# Altium footprint library custom.PcbLib: 317 footprints (part 12 of 20)
Each footprint in its own frame and in the unit in brackets; x right, y up, seen from the top. Pads: shape width x height; smd on the part's side, far side on the other; paste and mask are expansions set on the pad; w line width, h text height; cw(c..) or ccw(c..) is an arc to the next point about the centre after c.
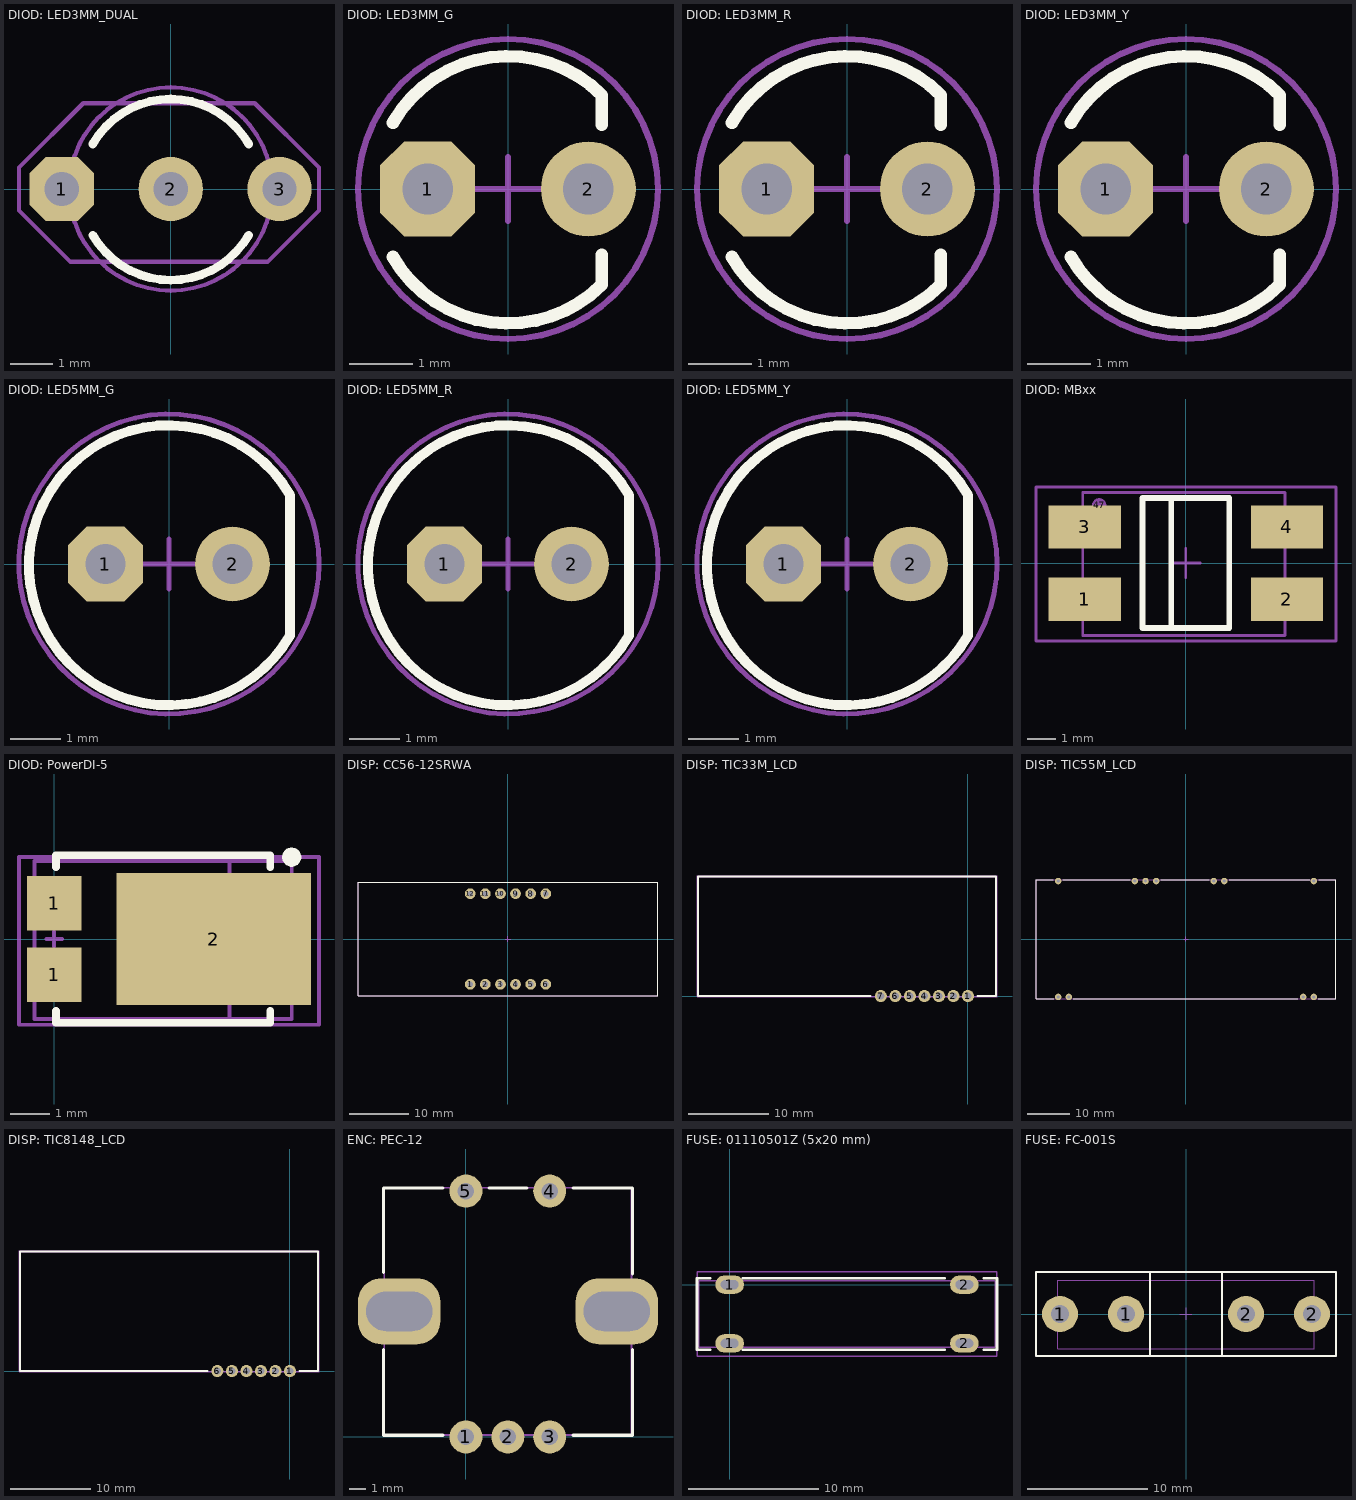
[diagram p11: the footprints below, top view; thin cyan lines are the x and y axes]

## DIOD: LED3MM_DUAL [mm] "Leaded Dual Color 3mm Led"
height 10
pads (3):
  oct 1.5x1.5 hole 0.8: 1(-2.54,0)
  round 1.5 hole 0.8: 2(0,0) 3(2.54,0)
Top Overlay:
  lines w0.2: -1.819,-1.075 ccw(c0,-0.025) 1.819,-1.075 ; -1.819,1.05 cw(c0,0) 1.819,1.05
Top Assy:
  circle w0.1: c0,0 r2.372
Size Area:
  lines w0.1: -3.54,-0.5 -2.34,-1.7 2.26,-1.7 3.46,-0.5 3.46,0.5 1.96,2 -2.04,2 -3.54,0.5 -3.54,-0.5 ; -0.5,0 0.5,0 -0.5,0 ; 0,-0.5 0,0.5 0,-0.5
3D body "3mm_led_dual.STEP": height 11.5, standoff -1, extent -2.846,-1.585 2.838,1.915

## DIOD: LED3MM_G [mm] "Green Leaded Led, 3 mm"
height 12
pads (2):
  oct 1.5x1.5 hole 0.8: 1(-1.27,0)
  round 1.5 hole 0.8: 2(1.27,0)
Top Overlay:
  lines w0.2: -1.819,-1.075 ccw(c0,-0.025) 1.485,-1.51 1.485,-1.04 ; -1.819,1.05 cw(c0,0) 1.485,1.485 1.485,1.015
Top Assy:
  circle w0.1: c0,0 r2.372
Size Area:
  circle w0.1: c0,0 r2.372
  lines w0.1: -0.5,0 0.5,0 ; 0,-0.5 0,0.5
3D body "3mm_led_grn.STEP": height 12, standoff -1, extent -2,-2 2,2

## DIOD: LED3MM_R [mm] "Red Leaded Led, 3 mm"
height 12
pads (2):
  oct 1.5x1.5 hole 0.8: 1(-1.27,0)
  round 1.5 hole 0.8: 2(1.27,0)
Top Overlay:
  lines w0.2: -1.819,-1.075 ccw(c0,-0.025) 1.485,-1.51 1.485,-1.04 ; -1.819,1.05 cw(c0,0) 1.485,1.485 1.485,1.015
Top Assy:
  circle w0.1: c0,0 r2.372
Size Area:
  circle w0.1: c0,0 r2.372
  lines w0.1: -0.5,0 0.5,0 ; 0,-0.5 0,0.5
3D body "3mm_led_red.STEP": height 12, standoff -1, extent -2,-2 2,2

## DIOD: LED3MM_Y [mm] "Yellow Leaded Led, 3 mm"
height 12
pads (2):
  oct 1.5x1.5 hole 0.8: 1(-1.27,0)
  round 1.5 hole 0.8: 2(1.27,0)
Top Overlay:
  lines w0.2: 1.485,-1.51 cw(c0,-0.025) -1.819,-1.075 ccw(c0,-0.025) 1.485,-1.51 ; 1.485,-1.51 1.485,-1.04 1.485,-1.51 ; 1.485,1.485 ccw(c0,0) -1.819,1.05 cw(c0,0) 1.485,1.485 ; 1.485,1.485 1.485,1.015 1.485,1.485
Top Assy:
  circle w0.1: c0,0 r2.372
Size Area:
  circle w0.1: c0,0 r2.372
  lines w0.1: -0.5,0 0.5,0 ; 0,-0.5 0,0.5
3D body "3mm_led_yell.STEP": height 12, standoff -1, extent -2,-2 2,2

## DIOD: LED5MM_G [mm] "Green Leaded Led, 5 mm"
height 12
pads (2):
  oct 1.5x1.5 hole 0.8: 1(-1.27,0)
  round 1.5 hole 0.8: 2(1.27,0)
Top Overlay:
  lines w0.2: 2.425,-1.425 cw(c0,-0.025) 2.425,1.375 2.425,-1.425
Top Assy:
  circle w0.1: c0,0 r3
Size Area:
  circle w0.1: c0,0 r3
  lines w0.1: -0.5,0 0.5,0 ; 0,-0.5 0,0.5
3D body "5mm_led_grn.STEP": height 14.5, standoff -1, extent -3,-3 3,3

## DIOD: LED5MM_R [mm] "Red Leaded Led, 5 mm"
height 12
pads (2):
  oct 1.5x1.5 hole 0.8: 1(-1.27,0)
  round 1.5 hole 0.8: 2(1.27,0)
Top Overlay:
  lines w0.2: 2.425,-1.425 cw(c0,-0.025) 2.425,1.375 2.425,-1.425
Top Assy:
  circle w0.1: c0,0 r3
Size Area:
  circle w0.1: c0,0 r3
  lines w0.1: -0.5,0 0.5,0 ; 0,-0.5 0,0.5
3D body "5mm_led_red.STEP": height 14.5, standoff -1, extent -3,-3 3,3

## DIOD: LED5MM_Y [mm] "Yellow Leaded Led, 5 mm"
height 12
pads (2):
  oct 1.5x1.5 hole 0.8: 1(-1.27,0)
  round 1.5 hole 0.8: 2(1.27,0)
Top Overlay:
  lines w0.2: 2.425,-1.425 cw(c0,-0.025) 2.425,1.375 2.425,-1.425
Top Assy:
  circle w0.1: c0,0 r3
Size Area:
  circle w0.1: c0,0 r3
  lines w0.1: -0.5,0 0.5,0 ; 0,-0.5 0,0.5
3D body "5mm_led_yell.STEP": height 14.5, standoff -1, extent -3,-3 3,3

## DIOD: MBxx [mm] "SMD Diode Bridge"
height 2
pads (5):
  rect 2.5x1.5 smd: 1(-3.5,-1.25) 2(3.5,-1.25) 3(-3.5,1.25) 4(3.5,1.25)
  round 0.5 on Mech1: 47(-3,2)
Top Overlay:
  lines w0.2: -0.5,-2.25 -0.5,2.25 ; -1.5,-2.25 1.5,-2.25 1.5,2.25 -1.5,2.25 -1.5,-2.25
Top Assy:
  lines w0.1: -3.566,-2.502 3.434,-2.502 3.434,2.448 -3.566,2.448 -3.566,-2.502
Size Area:
  lines w0.1: -0.5,0 0.5,0 ; 0,-0.5 0,0.5 ; -5.183,-2.694 5.197,-2.694 5.197,2.631 -5.183,2.631 -5.183,-2.694
3D body "MBxx.STEP": height 3.5, standoff -0.02, extent -3.566,-2.502 3.434,2.448

## DIOD: PowerDI-5 [mm]
pads (4):
  rect 1.4x1.4 smd: 1(0,-0.92) 1(0,0.92)
  rect 5x3.4 smd: 2(4.1,0)
  round 0.5 on Top Overlay: ""(6.1,2.1)
Top Overlay:
  lines w0.2: 0.05,-1.85 0.05,-2.15 5.55,-2.15 5.55,-1.85 ; 0.05,1.85 0.05,2.15 5.55,2.15 5.55,1.85
Top Assy:
  lines w0.1: 4.5,-2.05 4.5,2 ; -0.5,-2.05 6.1,-2.05 6.1,2 -0.5,2 -0.5,-2.05
Size Area:
  lines w0.1: -0.2,0 0.2,0 ; 0,-0.2 0,0.2 ; -0.9,-2.2 6.8,-2.2 6.8,2.1 -0.9,2.1 -0.9,-2.2
3D body "User Library-PowerDI-5.STEP": height 1.17, standoff 0.02, extent -0.5,-2.05 6.1,2

## DISP: CC56-12SRWA [mm]
height 8.1
pads (12):
  round 1.8 hole 0.9: 1(-6.35,-7.62) 2(-3.81,-7.62) 3(-1.27,-7.62) 4(1.27,-7.62) 5(3.81,-7.62) 6(6.35,-7.62) 7(6.35,7.62) 8(3.81,7.62) 9(1.27,7.62) 10(-1.27,7.62) 11(-3.81,7.62) 12(-6.35,7.62)
Top Overlay:
  lines w0.2: -25.2,-9.5 25.2,-9.5 25.2,9.5 -25.2,9.5 -25.2,-9.5
Top Assy:
  lines w0.1: -25.2,-9.5 25.2,-9.5 25.2,9.5 -25.2,9.5 -25.2,-9.5
Size Area:
  lines w0.1: -0.5,0 0.5,0 ; 0,-0.5 0,0.5 ; -25.2,-9.5 -25.2,9.5 25.2,9.5 25.2,-9.5 -25.2,-9.5
3D body "User Library-C-564 (7 segment 4 digit LED display).STEP": height 8, standoff -6.2, extent -25.2,-9.5 25.2,9.5

## DISP: TIC33M_LCD [mm]
height 15
pads (7):
  round 1.5 hole 0.9: 1(0,0) 2(-1.8,0) 3(-3.6,0) 4(-5.4,0) 5(-7.2,0) 6(-9,0) 7(-10.8,0)
Top Overlay:
  lines w0.254: -12.1,0 -33.5,0 -33.5,14.8 3.5,14.8 3.5,0 1.2,0
3D model:
  lines w0.05: -33.5,0 -33.5,14.8 3.5,14.8 3.5,0 -33.5,0
Size Area:
  lines w0.05: -33.6,-0.1 3.6,-0.1 3.6,14.9 -33.6,14.9 -33.6,-0.1
3D body "TIC33M.STEP": height 6.6, standoff -1.8, extent -33.5,-0.1 3.5,14.8

## DISP: TIC55M_LCD [mil]
height 590.55
pads (11):
  round 60 hole 30: 0(-1181.1,-535.43) 0(-1181.1,535.43) 0(-1082.68,-535.43) 0(1082.68,-535.43) 0(1181.1,-535.43) 0(1181.1,535.43) 1(-472.44,535.43) 2(-374.02,535.43) 3(-275.59,535.43) 4(255.91,535.43) 5(354.33,535.43)
Top Overlay:
  lines w10: -1228.35,547.24 -1385.83,547.24 -1385.83,-551.18 -1220.47,-551.18 ; -1137.8,547.24 -515.75,547.24 ; -1043.31,-551.18 1031.5,-551.18 ; -232.28,547.24 212.6,547.24 ; 397.64,547.24 1141.73,547.24 ; 1220.47,-551.18 1385.83,-551.18 1385.83,547.24 1228.35,547.24
3D model:
  lines w1.97: -1385.83,-551.18 -1385.83,547.24 1385.83,547.24 1385.83,-551.18 -1385.83,-551.18
Size Area:
  lines w1.97: -1385.83,-551.18 1385.83,-551.18 1385.83,547.24 -1385.83,547.24 -1385.83,-551.18
  lines w3.94: -19.69,0 19.68,0 ; 0,-19.68 0,19.69
3D body "��� TIC55M part.STEP": height 509.84, standoff -405.51, extent -1377.95,-541.34 1377.95,539.37

## DISP: TIC8148_LCD [mm]
height 15
pads (6):
  round 1.5 hole 0.9: 1(0,0) 2(-1.8,0) 3(-3.6,0) 4(-5.4,0) 5(-7.2,0) 6(-9,0)
Top Overlay:
  lines w0.254: -10.2,0 -33.5,0 -33.5,14.8 3.5,14.8 3.5,0 1.2,0
3D model:
  lines w0.05: -33.5,0 3.5,0 3.5,14.8 -33.5,14.8 -33.5,0
Size Area:
  lines w0.05: -33.6,-0.1 -33.6,14.9 3.6,14.9 3.6,-0.1 -33.6,-0.1
3D body "TIC33M.STEP": height 6.6, standoff -1.8, extent -33.5,-0.1 3.5,14.8

## ENC: PEC-12 [mm]
pads (7):
  round 2 hole 1: 1(0,0) 2(2.54,0) 3(5.08,0) 4(5.08,14.922) 5(0,14.922)
  rrect70% 5x4 hole 2.4 slot 4 at 0 deg: ""(-4.05,7.625) ""(9.15,7.625)
Top Overlay:
  lines w0.2: -5,5.3 -5,0.1 -1.4,0.1 ; -5,10 -5,15.1 -1.4,15.1 ; 1.4,15.1 3.7,15.1 ; 6.5,0.1 10.1,0.1 10.1,5.3 ; 6.5,15.1 10.1,15.1 10.1,9.9
Top Assy:
  lines w0.1: -4.966,0.12 -4.966,15.12 10.046,15.12 10.046,0.12 -4.966,0.12
3D body "User Library-rotacijski enkoder.STEP": height 16.5, standoff -4.53, extent -4.964,0.12 10.044,15.12

## FUSE: 01110501Z (5x20 mm) [mm]
pads (4):
  oval 2.2x1.4 hole 0.7 slot 1.35 at 0 deg: 1(0,-4.5) 1(0,0) 2(18,-4.5) 2(18,0)
Top Overlay:
  lines w0.2: -1.5,-5 -2.5,-5 -2.5,0.5 -1.5,0.5 ; 1,-5 16.5,-5 ; 1,0.5 16.5,0.5 ; 19.5,-5 20.5,-5 20.5,0.5 19.5,0.5
Top Assy:
  lines w0.1: 20.35,-4.8 20.35,-4.8 ; 20.35,-4.8 20.35,0.3 ; 20.35,-4.8 -2.35,-4.8 -2.35,0.3 20.35,0.3 ; 20.35,0.3 20.35,0.3
Size Area:
  lines w0.1: -2.5,-5.5 -2.5,1 20.5,1 20.5,-5.5 -2.5,-5.5
3D body "01110501Z.STEP": height 7.25, standoff -3.1, extent -2.35,-4.8 2.45,0.3
3D body "01110501Z.STEP": height 7.25, standoff -3.1, extent 15.55,-4.8 20.35,0.3
3D body "User Library-FUSIVEL.STEP": height 8.5, standoff 3.5, extent -1,-4.7 19,0.3

## FUSE: FC-001S [mm]
height 15
pads (4):
  round 3 hole 1.5: 1(-10.5,0) 1(-5,0) 2(5,0) 2(10.5,0)
Top Overlay:
  lines w0.2: -3,-3.5 -3,3.5 ; 3,-3.5 3,3.5 ; -12.5,-3.5 12.5,-3.5 12.5,3.5 -12.5,3.5 -12.5,-3.5
Top Assy:
  lines w0.1: -3,-2.9 -3,2.8 ; 3,-2.9 3,2.8 ; -10.7,-2.9 -10.7,2.8 10.7,2.8 10.7,-2.9 -10.7,-2.9
Size Area:
  lines w0.1: -0.5,0 0.5,0 ; 0,-0.5 0,0.5 ; -12.5,-3.5 12.5,-3.5 12.5,3.5 -12.5,3.5 -12.5,-3.5
3D body "FC-001S.STEP": height 5.5, standoff -2.81, extent -10.7,-2.9 10.7,2.798